# Altium footprint library Connectors THD.PcbLib: 631 footprints (part 34 of 46)
Each footprint in its own frame and in the unit in brackets; x right, y up, seen from the top. Pads: shape width x height; smd on the part's side, far side on the other; paste and mask are expansions set on the pad; w line width, h text height; cw(c..) or ccw(c..) is an arc to the next point about the centre after c.
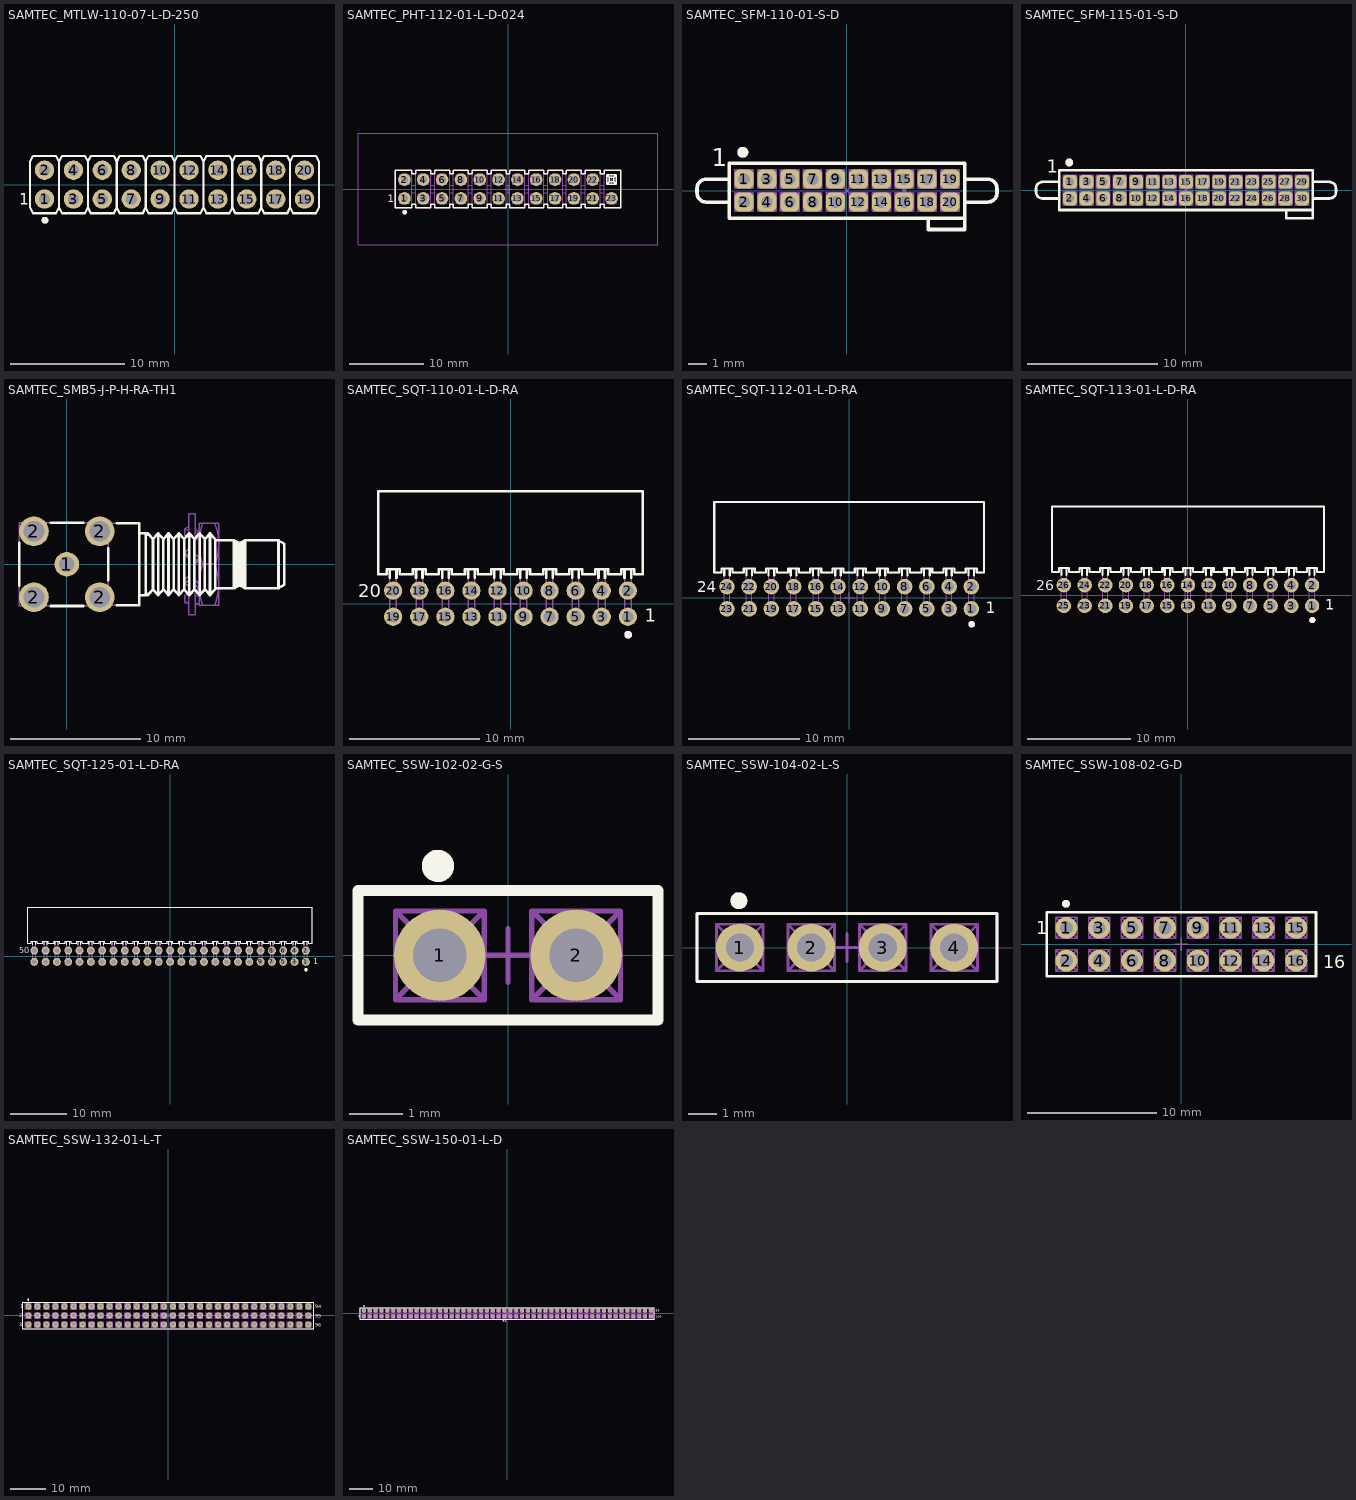
[diagram p33: the footprints below, top view; thin cyan lines are the x and y axes]

## SAMTEC_MTLW-110-07-L-D-250 [mm] "20 Contacts - Pitch 2.54mm - Dual Row Through Mount Straight Header (Post Lead = 6.35mm, Tail Lead 3.05mm, Insulator 1.52mm)"
height 7.87
pads (20):
  round 1.7 hole 1: 1(-11.43,-1.27) 2(-11.43,1.27) 3(-8.89,-1.27) 4(-8.89,1.27) 5(-6.35,-1.27) 6(-6.35,1.27) 7(-3.81,-1.27) 8(-3.81,1.27) 9(-1.27,-1.27) 10(-1.27,1.27) 11(1.27,-1.27) 12(1.27,1.27) 13(3.81,-1.27) 14(3.81,1.27) 15(6.35,-1.27) 16(6.35,1.27) 17(8.89,-1.27) 18(8.89,1.27) 19(11.43,-1.27) 20(11.43,1.27)
Top Overlay:
  circle w0.3: c-11.395,-3.135 r0.15
  lines w0.2: -10.16,-2.007 -10.414,-2.515 -12.446,-2.515 -12.7,-2.007 -12.7,2.007 -12.446,2.515 -10.414,2.515 -10.16,2.007 ; -10.16,-2.007 -10.16,2.007 ; -10.16,-2.007 -10.16,2.007 ; -10.16,-2.007 -9.906,-2.515 -7.874,-2.515 -7.62,-2.007 ; -10.16,2.007 -9.906,2.515 -7.874,2.515 -7.62,2.007 ; -7.62,-2.007 -7.62,2.007 ; -7.62,-2.007 -7.62,2.007 ; -7.62,-2.007 -7.366,-2.515 -5.334,-2.515 -5.08,-2.007 ; -7.62,2.007 -7.366,2.515 -5.334,2.515 -5.08,2.007 ; -5.08,-2.007 -5.08,2.007 ; -5.08,-2.007 -4.826,-2.515 -2.794,-2.515 -2.54,-2.007 ; -5.08,-2.007 -5.08,2.007 ; -5.08,2.007 -4.826,2.515 -2.794,2.515 -2.54,2.007 ; -2.54,-2.007 -2.54,2.007 ; -2.54,-2.007 -2.286,-2.515 -0.254,-2.515 0,-2.007 ; -2.54,-2.007 -2.54,2.007 ; -2.54,2.007 -2.286,2.515 -0.254,2.515 0,2.007 ; 0,-2.007 0,2.007 ; 0,-2.007 0.254,-2.515 2.286,-2.515 2.54,-2.007 ; 0,-2.007 0,2.007 ; 0,2.007 0.254,2.515 2.286,2.515 2.54,2.007 ; 2.54,-2.007 2.54,2.007 ; 2.54,-2.007 2.54,2.007 ; 2.54,-2.007 2.794,-2.515 4.826,-2.515 5.08,-2.007 ; 2.54,2.007 2.794,2.515 4.826,2.515 5.08,2.007 ; 5.08,-2.007 5.08,2.007 ; 5.08,-2.007 5.08,2.007 ; 5.08,-2.007 5.334,-2.515 7.366,-2.515 7.62,-2.007 ; 5.08,2.007 5.334,2.515 7.366,2.515 7.62,2.007 ; 7.62,-2.007 7.62,2.007 ; 7.62,-2.007 7.874,-2.515 9.906,-2.515 10.16,-2.007 ; 7.62,-2.007 7.62,2.007 ; 7.62,2.007 7.874,2.515 9.906,2.515 10.16,2.007 ; 10.16,-2.007 10.16,2.007 ; 10.16,-2.007 10.414,-2.515 12.446,-2.515 12.7,-2.007 12.7,2.007 12.446,2.515 10.414,2.515 10.16,2.007 ; 10.16,-2.007 10.16,2.007
  text "1" at -13.677,-1.768 h1
Mechanical 8:
  lines w0.1: -11.93,-1.27 -11.43,-1.27 ; -11.93,1.27 -11.43,1.27 ; -11.43,-1.77 -11.43,-1.27 ; -11.43,-0.77 -11.43,-1.27 ; -11.43,0.77 -11.43,1.27 ; -11.43,1.77 -11.43,1.27 ; -10.93,-1.27 -11.43,-1.27 ; -10.93,1.27 -11.43,1.27 ; -9.39,-1.27 -8.89,-1.27 ; -9.39,1.27 -8.89,1.27 ; -8.89,-1.77 -8.89,-1.27 ; -8.89,-0.77 -8.89,-1.27 ; -8.89,0.77 -8.89,1.27 ; -8.89,1.77 -8.89,1.27 ; -8.39,-1.27 -8.89,-1.27 ; -8.39,1.27 -8.89,1.27 ; -6.85,-1.27 -6.35,-1.27 ; -6.85,1.27 -6.35,1.27 ; -6.35,-1.77 -6.35,-1.27 ; -6.35,-0.77 -6.35,-1.27 ; -6.35,0.77 -6.35,1.27 ; -6.35,1.77 -6.35,1.27 ; -5.85,-1.27 -6.35,-1.27 ; -5.85,1.27 -6.35,1.27 ; -4.31,-1.27 -3.81,-1.27 ; -4.31,1.27 -3.81,1.27 ; -3.81,-1.77 -3.81,-1.27 ; -3.81,-0.77 -3.81,-1.27 ; -3.81,0.77 -3.81,1.27 ; -3.81,1.77 -3.81,1.27 ; -3.31,-1.27 -3.81,-1.27 ; -3.31,1.27 -3.81,1.27 ; -1.77,-1.27 -1.27,-1.27 ; -1.77,1.27 -1.27,1.27 ; -1.27,-1.77 -1.27,-1.27 ; -1.27,-0.77 -1.27,-1.27 ; -1.27,0.77 -1.27,1.27 ; -1.27,1.77 -1.27,1.27 ; -0.77,-1.27 -1.27,-1.27 ; -0.77,1.27 -1.27,1.27 ; -0.5,0 0,0 ; 0,-0.5 0,0 ; 0,0.5 0,0 ; 0.5,0 0,0 ; 0.77,-1.27 1.27,-1.27 ; 0.77,1.27 1.27,1.27 ; 1.27,-1.77 1.27,-1.27 ; 1.27,-0.77 1.27,-1.27 ; 1.27,0.77 1.27,1.27 ; 1.27,1.77 1.27,1.27 ; 1.77,-1.27 1.27,-1.27 ; 1.77,1.27 1.27,1.27 ; 3.31,-1.27 3.81,-1.27 ; 3.31,1.27 3.81,1.27 ; 3.81,-1.77 3.81,-1.27 ; 3.81,-0.77 3.81,-1.27 ; 3.81,0.77 3.81,1.27 ; 3.81,1.77 3.81,1.27 ; 4.31,-1.27 3.81,-1.27 ; 4.31,1.27 3.81,1.27 ; 5.85,-1.27 6.35,-1.27 ; 5.85,1.27 6.35,1.27 ; 6.35,-1.77 6.35,-1.27 ; 6.35,-0.77 6.35,-1.27 ; 6.35,0.77 6.35,1.27 ; 6.35,1.77 6.35,1.27 ; 6.85,-1.27 6.35,-1.27 ; 6.85,1.27 6.35,1.27 ; 8.39,-1.27 8.89,-1.27 ; 8.39,1.27 8.89,1.27 ; 8.89,-1.77 8.89,-1.27 ; 8.89,-0.77 8.89,-1.27 ; 8.89,0.77 8.89,1.27 ; 8.89,1.77 8.89,1.27 ; 9.39,-1.27 8.89,-1.27 ; 9.39,1.27 8.89,1.27 ; 10.93,-1.27 11.43,-1.27 ; 10.93,1.27 11.43,1.27 ; 11.43,-1.77 11.43,-1.27 ; 11.43,-0.77 11.43,-1.27 ; 11.43,0.77 11.43,1.27 ; 11.43,1.77 11.43,1.27 ; 11.93,-1.27 11.43,-1.27 ; 11.93,1.27 11.43,1.27
Mechanical 14:
  drawing of 161 lines, arcs and shapes, not listed
  text "1" at -13.677,-1.768 h1
3D body: height 7.87, standoff -3.05, extent -12.7,-2.514 12.7,2.515

## SAMTEC_PHT-112-01-L-D-024 [mm] "23 Contacts +1 Polarized Position(24) , Pitch 2.54mm - Dual Row, Press-Fit Straigh Header"
height 11.48
pads (23):
  round 1.7 hole 1: 1(-13.97,-1.27) 2(-13.97,1.27) 3(-11.43,-1.27) 4(-11.43,1.27) 5(-8.89,-1.27) 6(-8.89,1.27) 7(-6.35,-1.27) 8(-6.35,1.27) 9(-3.81,-1.27) 10(-3.81,1.27) 11(-1.27,-1.27) 12(-1.27,1.27) 13(1.27,-1.27) 14(1.27,1.27) 15(3.81,-1.27) 16(3.81,1.27) 17(6.35,-1.27) 18(6.35,1.27) 19(8.89,-1.27) 20(8.89,1.27) 21(11.43,-1.27) 22(11.43,1.27) 23(13.97,-1.27)
Top Overlay:
  circle w0.3: c-13.935,-3.135 r0.15
  lines w0.2: -12.827,-2.032 -12.573,-2.032 ; -10.287,-2.032 -10.033,-2.032 ; -10.287,2.032 -10.033,2.032 ; 13.322,0.622 14.618,0.622 ; 13.322,0.622 13.322,1.918 ; 13.322,0.622 13.653,0.953 ; 13.322,1.918 14.618,1.918 ; 13.322,1.918 13.653,1.587 ; 13.653,0.953 14.288,0.953 ; 13.653,0.953 13.653,1.587 ; 13.653,1.587 14.288,1.587 ; 14.288,0.953 14.288,1.587 ; 14.288,0.953 14.618,0.622 ; 14.288,1.587 14.618,1.918 ; 14.618,0.622 14.618,1.918 ; 15.24,-2.515 15.24,2.515 ; 15.24,-2.515 12.954,-2.515 12.954,-2.032 12.446,-2.032 12.446,-2.515 10.414,-2.515 10.414,-2.032 9.906,-2.032 9.906,-2.515 7.874,-2.515 7.874,-2.032 7.366,-2.032 7.366,-2.515 5.334,-2.515 5.334,-2.032 4.826,-2.032 4.826,-2.515 2.794,-2.515 2.794,-2.032 2.286,-2.032 2.286,-2.515 0.254,-2.515 0.254,-2.032 -0.254,-2.032 -0.254,-2.515 -2.286,-2.515 -2.286,-2.032 -2.794,-2.032 -2.794,-2.515 -4.826,-2.515 -4.826,-2.032 -5.334,-2.032 -5.334,-2.515 -7.366,-2.515 -7.366,-2.032 -7.874,-2.032 -7.874,-2.515 -9.906,-2.515 -9.906,-2.032 -10.414,-2.032 -10.414,-2.515 -12.446,-2.515 -12.446,-2.032 -12.954,-2.032 -12.954,-2.515 -15.24,-2.515 -15.24,2.515 -12.954,2.515 -12.954,2.032 -12.446,2.032 -12.446,2.515 -10.414,2.515 -10.414,2.032 -9.906,2.032 -9.906,2.515 -7.874,2.515 -7.874,2.032 -7.366,2.032 -7.366,2.515 -5.334,2.515 -5.334,2.032 -4.826,2.032 -4.826,2.515 -2.794,2.515 -2.794,2.032 -2.286,2.032 -2.286,2.515 -0.254,2.515 -0.254,2.032 0.254,2.032 0.254,2.515 2.286,2.515 2.286,2.032 2.794,2.032 2.794,2.515 4.826,2.515 4.826,2.032 5.334,2.032 5.334,2.515 7.366,2.515 7.366,2.032 7.874,2.032 7.874,2.515 9.906,2.515 9.906,2.032 10.414,2.032 10.414,2.515 12.446,2.515 12.446,2.032 12.954,2.032 12.954,2.515 15.24,2.515 ; 15.24,-2.515 15.24,2.515
  text "1" at -16.217,-1.768 h1
Mechanical 8:
  lines w0.1: -14.47,-1.27 -13.97,-1.27 ; -14.47,1.27 -13.97,1.27 ; -13.97,-1.77 -13.97,-1.27 ; -13.97,-0.77 -13.97,-1.27 ; -13.97,0.77 -13.97,1.27 ; -13.97,1.77 -13.97,1.27 ; -13.47,-1.27 -13.97,-1.27 ; -13.47,1.27 -13.97,1.27 ; -11.93,-1.27 -11.43,-1.27 ; -11.93,1.27 -11.43,1.27 ; -11.43,-1.77 -11.43,-1.27 ; -11.43,-0.77 -11.43,-1.27 ; -11.43,0.77 -11.43,1.27 ; -11.43,1.77 -11.43,1.27 ; -10.93,-1.27 -11.43,-1.27 ; -10.93,1.27 -11.43,1.27 ; -9.39,-1.27 -8.89,-1.27 ; -9.39,1.27 -8.89,1.27 ; -8.89,-1.77 -8.89,-1.27 ; -8.89,-0.77 -8.89,-1.27 ; -8.89,0.77 -8.89,1.27 ; -8.89,1.77 -8.89,1.27 ; -8.39,-1.27 -8.89,-1.27 ; -8.39,1.27 -8.89,1.27 ; -6.85,-1.27 -6.35,-1.27 ; -6.85,1.27 -6.35,1.27 ; -6.35,-1.77 -6.35,-1.27 ; -6.35,-0.77 -6.35,-1.27 ; -6.35,0.77 -6.35,1.27 ; -6.35,1.77 -6.35,1.27 ; -5.85,-1.27 -6.35,-1.27 ; -5.85,1.27 -6.35,1.27 ; -4.31,-1.27 -3.81,-1.27 ; -4.31,1.27 -3.81,1.27 ; -3.81,-1.77 -3.81,-1.27 ; -3.81,-0.77 -3.81,-1.27 ; -3.81,0.77 -3.81,1.27 ; -3.81,1.77 -3.81,1.27 ; -3.31,-1.27 -3.81,-1.27 ; -3.31,1.27 -3.81,1.27 ; -1.77,-1.27 -1.27,-1.27 ; -1.77,1.27 -1.27,1.27 ; -1.27,-1.77 -1.27,-1.27 ; -1.27,-0.77 -1.27,-1.27 ; -1.27,0.77 -1.27,1.27 ; -1.27,1.77 -1.27,1.27 ; -0.77,-1.27 -1.27,-1.27 ; -0.77,1.27 -1.27,1.27 ; -0.5,0 0,0 ; 0,-0.5 0,0 ; 0,0.5 0,0 ; 0.5,0 0,0 ; 0.77,-1.27 1.27,-1.27 ; 0.77,1.27 1.27,1.27 ; 1.27,-1.77 1.27,-1.27 ; 1.27,-0.77 1.27,-1.27 ; 1.27,0.77 1.27,1.27 ; 1.27,1.77 1.27,1.27 ; 1.77,-1.27 1.27,-1.27 ; 1.77,1.27 1.27,1.27 ; 3.31,-1.27 3.81,-1.27 ; 3.31,1.27 3.81,1.27 ; 3.81,-1.77 3.81,-1.27 ; 3.81,-0.77 3.81,-1.27 ; 3.81,0.77 3.81,1.27 ; 3.81,1.77 3.81,1.27 ; 4.31,-1.27 3.81,-1.27 ; 4.31,1.27 3.81,1.27 ; 5.85,-1.27 6.35,-1.27 ; 5.85,1.27 6.35,1.27 ; 6.35,-1.77 6.35,-1.27 ; 6.35,-0.77 6.35,-1.27 ; 6.35,0.77 6.35,1.27 ; 6.35,1.77 6.35,1.27 ; 6.85,-1.27 6.35,-1.27 ; 6.85,1.27 6.35,1.27 ; 8.39,-1.27 8.89,-1.27 ; 8.39,1.27 8.89,1.27 ; 8.89,-1.77 8.89,-1.27 ; 8.89,-0.77 8.89,-1.27 ; 8.89,0.77 8.89,1.27 ; 8.89,1.77 8.89,1.27 ; 9.39,-1.27 8.89,-1.27 ; 9.39,1.27 8.89,1.27 ; 10.93,-1.27 11.43,-1.27 ; 10.93,1.27 11.43,1.27 ; 11.43,-1.77 11.43,-1.27 ; 11.43,-0.77 11.43,-1.27 ; 11.43,0.77 11.43,1.27 ; 11.43,1.77 11.43,1.27 ; 11.93,-1.27 11.43,-1.27 ; 11.93,1.27 11.43,1.27 ; 13.47,-1.27 13.97,-1.27 ; 13.47,1.27 13.97,1.27 ; 13.97,-1.77 13.97,-1.27 ; 13.97,-0.77 13.97,-1.27 ; 13.97,0.77 13.97,1.27 ; 13.97,1.77 13.97,1.27 ; 14.47,-1.27 13.97,-1.27 ; 14.47,1.27 13.97,1.27
Mechanical 14:
  drawing of 380 lines, arcs and shapes, not listed
  text "1" at -16.217,-1.768 h1
Mechanical 15:
  lines w0.05: -20.24,-7.54 20.24,-7.54 20.24,7.54 -20.24,7.54 -20.24,-7.54
  text "Do Not Put Any Component With a Height More Than" at -19.6,3.075 h1
  text "4mm Tickness on a Zone of 5mm Around The Connector." at -20.24,-3.775 h1
Drill Drawing:
  lines w0.1: -15.24,-4.81 -15.24,4.6 15.24,4.6 15.24,-4.81 -15.24,-4.81
  text "Diam. 1mm +0.09 -0.06" at -9.45,-4.15 h1
  text "PRESS-FIT TECHNOLOGY" at -9.3,3.15 h1
3D body: height 8.38, standoff -3.1, extent -15.24,-2.515 15.24,2.515

## SAMTEC_SFM-110-01-S-D [mm] "20 Contacts - Pitch 1.27mm - Dual Row Straight Through-Hole Socket"
height 4.57
pads (20):
  rrect50% 1.05x1.05 hole 0.65: 1(-5.715,0.635) 2(-5.715,-0.635) 3(-4.445,0.635) 4(-4.445,-0.635) 5(-3.175,0.635) 6(-3.175,-0.635) 7(-1.905,0.635) 8(-1.905,-0.635) 9(-0.635,0.635) 10(-0.635,-0.635) 11(0.635,0.635) 12(0.635,-0.635) 13(1.905,0.635) 14(1.905,-0.635) 15(3.175,0.635) 16(3.175,-0.635) 17(4.445,0.635) 18(4.445,-0.635) 19(5.715,0.635) 20(5.715,-0.635)
Top Overlay:
  circle w0.3: c-5.775,2.125 r0.15
  lines w0.2: -6.54,-0.635 -7.81,-0.635 cw(c-7.81,-0.127) -8.318,-0.127 -8.318,0.127 cw(c-7.81,0.127) -7.81,0.635 -6.54,0.635 ; 4.509,-1.524 4.509,-2.159 6.541,-2.159 6.541,1.524 -6.54,1.524 -6.54,-1.524 6.541,-1.524 ; 6.541,-0.635 7.811,-0.635 ccw(c7.811,-0.127) 8.319,-0.127 8.319,0.127 ccw(c7.811,0.127) 7.811,0.635 6.541,0.635
  text "1" at -7.487,1.337 h1
Mechanical 8:
  lines w0.1: -6.215,-0.635 -5.715,-0.635 ; -6.215,0.635 -5.715,0.635 ; -5.715,-1.135 -5.715,-0.635 ; -5.715,-0.135 -5.715,-0.635 ; -5.715,0.135 -5.715,0.635 ; -5.715,1.135 -5.715,0.635 ; -5.215,-0.635 -5.715,-0.635 ; -5.215,0.635 -5.715,0.635 ; -4.945,-0.635 -4.445,-0.635 ; -4.945,0.635 -4.445,0.635 ; -4.445,-1.135 -4.445,-0.635 ; -4.445,-0.135 -4.445,-0.635 ; -4.445,0.135 -4.445,0.635 ; -4.445,1.135 -4.445,0.635 ; -3.945,-0.635 -4.445,-0.635 ; -3.945,0.635 -4.445,0.635 ; -3.675,-0.635 -3.175,-0.635 ; -3.675,0.635 -3.175,0.635 ; -3.175,-1.135 -3.175,-0.635 ; -3.175,-0.135 -3.175,-0.635 ; -3.175,0.135 -3.175,0.635 ; -3.175,1.135 -3.175,0.635 ; -2.675,-0.635 -3.175,-0.635 ; -2.675,0.635 -3.175,0.635 ; -2.405,-0.635 -1.905,-0.635 ; -2.405,0.635 -1.905,0.635 ; -1.905,-1.135 -1.905,-0.635 ; -1.905,-0.135 -1.905,-0.635 ; -1.905,0.135 -1.905,0.635 ; -1.905,1.135 -1.905,0.635 ; -1.405,-0.635 -1.905,-0.635 ; -1.405,0.635 -1.905,0.635 ; -1.135,-0.635 -0.635,-0.635 ; -1.135,0.635 -0.635,0.635 ; -0.635,-1.135 -0.635,-0.635 ; -0.635,-0.135 -0.635,-0.635 ; -0.635,0.135 -0.635,0.635 ; -0.635,1.135 -0.635,0.635 ; -0.354,-0.354 0,0 ; -0.354,0.354 0,0 ; -0.135,-0.635 -0.635,-0.635 ; -0.135,0.635 -0.635,0.635 ; 0.135,-0.635 0.635,-0.635 ; 0.135,0.635 0.635,0.635 ; 0.354,-0.354 0,0 ; 0.354,0.354 0,0 ; 0.635,-1.135 0.635,-0.635 ; 0.635,-0.135 0.635,-0.635 ; 0.635,0.135 0.635,0.635 ; 0.635,1.135 0.635,0.635 ; 1.135,-0.635 0.635,-0.635 ; 1.135,0.635 0.635,0.635 ; 1.405,-0.635 1.905,-0.635 ; 1.405,0.635 1.905,0.635 ; 1.905,-1.135 1.905,-0.635 ; 1.905,-0.135 1.905,-0.635 ; 1.905,0.135 1.905,0.635 ; 1.905,1.135 1.905,0.635 ; 2.405,-0.635 1.905,-0.635 ; 2.405,0.635 1.905,0.635 ; 2.675,-0.635 3.175,-0.635 ; 2.675,0.635 3.175,0.635 ; 2.821,-0.354 3.175,0 ; 2.821,0.354 3.175,0 ; 3.175,-1.135 3.175,-0.635 ; 3.175,-0.135 3.175,-0.635 ; 3.175,0.135 3.175,0.635 ; 3.175,1.135 3.175,0.635 ; 3.529,-0.354 3.175,0 ; 3.529,0.354 3.175,0 ; 3.675,-0.635 3.175,-0.635 ; 3.675,0.635 3.175,0.635 ; 3.945,-0.635 4.445,-0.635 ; 3.945,0.635 4.445,0.635 ; 4.445,-1.135 4.445,-0.635 ; 4.445,-0.135 4.445,-0.635 ; 4.445,0.135 4.445,0.635 ; 4.445,1.135 4.445,0.635 ; 4.945,-0.635 4.445,-0.635 ; 4.945,0.635 4.445,0.635 ; 5.215,-0.635 5.715,-0.635 ; 5.215,0.635 5.715,0.635 ; 5.715,-1.135 5.715,-0.635 ; 5.715,-0.135 5.715,-0.635 ; 5.715,0.135 5.715,0.635 ; 5.715,1.135 5.715,0.635 ; 6.215,-0.635 5.715,-0.635 ; 6.215,0.635 5.715,0.635
Mechanical 14:
  drawing of 385 lines, arcs and shapes, not listed
  text "1" at -7.487,1.337 h1
3D body: height 4.57, standoff -2.74, extent -8.318,-2.159 8.319,1.524

## SAMTEC_SFM-115-01-S-D [mm] "30 Contacts - Pitch 1.27mm - Dual Row Straight Through-Hole Socket"
height 4.57
pads (30):
  rrect50% 1.05x1.05 hole 0.65: 1(-8.89,0.635) 2(-8.89,-0.635) 3(-7.62,0.635) 4(-7.62,-0.635) 5(-6.35,0.635) 6(-6.35,-0.635) 7(-5.08,0.635) 8(-5.08,-0.635) 9(-3.81,0.635) 10(-3.81,-0.635) 11(-2.54,0.635) 12(-2.54,-0.635) 13(-1.27,0.635) 14(-1.27,-0.635) 15(0,0.635) 16(0,-0.635) 17(1.27,0.635) 18(1.27,-0.635) 19(2.54,0.635) 20(2.54,-0.635) 21(3.81,0.635) 22(3.81,-0.635) 23(5.08,0.635) 24(5.08,-0.635) 25(6.35,0.635) 26(6.35,-0.635) 27(7.62,0.635) 28(7.62,-0.635) 29(8.89,0.635) 30(8.89,-0.635)
Top Overlay:
  circle w0.3: c-8.95,2.125 r0.15
  lines w0.2: -9.715,-0.635 -10.985,-0.635 cw(c-10.985,-0.127) -11.493,-0.127 -11.493,0.127 cw(c-10.985,0.127) -10.985,0.635 -9.715,0.635 ; 7.684,-1.524 7.684,-2.159 9.716,-2.159 9.716,1.524 -9.715,1.524 -9.715,-1.524 9.716,-1.524 ; 9.716,-0.635 10.986,-0.635 ccw(c10.986,-0.127) 11.494,-0.127 11.494,0.127 ccw(c10.986,0.127) 10.986,0.635 9.716,0.635
  text "1" at -10.662,1.337 h1
Mechanical 8:
  lines w0.1: -9.39,-0.635 -8.89,-0.635 ; -9.39,0.635 -8.89,0.635 ; -8.89,-1.135 -8.89,-0.635 ; -8.89,-0.135 -8.89,-0.635 ; -8.89,0.135 -8.89,0.635 ; -8.89,1.135 -8.89,0.635 ; -8.39,-0.635 -8.89,-0.635 ; -8.39,0.635 -8.89,0.635 ; -8.12,-0.635 -7.62,-0.635 ; -8.12,0.635 -7.62,0.635 ; -7.62,-1.135 -7.62,-0.635 ; -7.62,-0.135 -7.62,-0.635 ; -7.62,0.135 -7.62,0.635 ; -7.62,1.135 -7.62,0.635 ; -7.12,-0.635 -7.62,-0.635 ; -7.12,0.635 -7.62,0.635 ; -6.85,-0.635 -6.35,-0.635 ; -6.85,0.635 -6.35,0.635 ; -6.35,-1.135 -6.35,-0.635 ; -6.35,-0.135 -6.35,-0.635 ; -6.35,0.135 -6.35,0.635 ; -6.35,1.135 -6.35,0.635 ; -5.85,-0.635 -6.35,-0.635 ; -5.85,0.635 -6.35,0.635 ; -5.58,-0.635 -5.08,-0.635 ; -5.58,0.635 -5.08,0.635 ; -5.08,-1.135 -5.08,-0.635 ; -5.08,-0.135 -5.08,-0.635 ; -5.08,0.135 -5.08,0.635 ; -5.08,1.135 -5.08,0.635 ; -4.58,-0.635 -5.08,-0.635 ; -4.58,0.635 -5.08,0.635 ; -4.31,-0.635 -3.81,-0.635 ; -4.31,0.635 -3.81,0.635 ; -3.81,-1.135 -3.81,-0.635 ; -3.81,-0.135 -3.81,-0.635 ; -3.81,0.135 -3.81,0.635 ; -3.81,1.135 -3.81,0.635 ; -3.31,-0.635 -3.81,-0.635 ; -3.31,0.635 -3.81,0.635 ; -3.04,-0.635 -2.54,-0.635 ; -3.04,0.635 -2.54,0.635 ; -2.54,-1.135 -2.54,-0.635 ; -2.54,-0.135 -2.54,-0.635 ; -2.54,0.135 -2.54,0.635 ; -2.54,1.135 -2.54,0.635 ; -2.04,-0.635 -2.54,-0.635 ; -2.04,0.635 -2.54,0.635 ; -1.77,-0.635 -1.27,-0.635 ; -1.77,0.635 -1.27,0.635 ; -1.27,-1.135 -1.27,-0.635 ; -1.27,-0.135 -1.27,-0.635 ; -1.27,0.135 -1.27,0.635 ; -1.27,1.135 -1.27,0.635 ; -0.77,-0.635 -1.27,-0.635 ; -0.77,0.635 -1.27,0.635 ; -0.5,-0.635 0,-0.635 ; -0.5,0.635 0,0.635 ; -0.354,-0.354 0,0 ; -0.354,0.354 0,0 ; 0,-1.135 0,-0.635 ; 0,-0.135 0,-0.635 ; 0,0.135 0,0.635 ; 0,1.135 0,0.635 ; 0.354,-0.354 0,0 ; 0.354,0.354 0,0 ; 0.5,-0.635 0,-0.635 ; 0.5,0.635 0,0.635 ; 0.77,-0.635 1.27,-0.635 ; 0.77,0.635 1.27,0.635 ; 1.27,-1.135 1.27,-0.635 ; 1.27,-0.135 1.27,-0.635 ; 1.27,0.135 1.27,0.635 ; 1.27,1.135 1.27,0.635 ; 1.77,-0.635 1.27,-0.635 ; 1.77,0.635 1.27,0.635 ; 2.04,-0.635 2.54,-0.635 ; 2.04,0.635 2.54,0.635 ; 2.54,-1.135 2.54,-0.635 ; 2.54,-0.135 2.54,-0.635 ; 2.54,0.135 2.54,0.635 ; 2.54,1.135 2.54,0.635 ; 3.04,-0.635 2.54,-0.635 ; 3.04,0.635 2.54,0.635 ; 3.31,-0.635 3.81,-0.635 ; 3.31,0.635 3.81,0.635 ; 3.81,-1.135 3.81,-0.635 ; 3.81,-0.135 3.81,-0.635 ; 3.81,0.135 3.81,0.635 ; 3.81,1.135 3.81,0.635 ; 4.31,-0.635 3.81,-0.635 ; 4.31,0.635 3.81,0.635 ; 4.58,-0.635 5.08,-0.635 ; 4.58,0.635 5.08,0.635 ; 5.08,-1.135 5.08,-0.635 ; 5.08,-0.135 5.08,-0.635 ; 5.08,0.135 5.08,0.635 ; 5.08,1.135 5.08,0.635 ; 5.58,-0.635 5.08,-0.635 ; 5.58,0.635 5.08,0.635 ; 5.85,-0.635 6.35,-0.635 ; 5.85,0.635 6.35,0.635 ; 6.35,-1.135 6.35,-0.635 ; 6.35,-0.135 6.35,-0.635 ; 6.35,0.135 6.35,0.635 ; 6.35,1.135 6.35,0.635 ; 6.85,-0.635 6.35,-0.635 ; 6.85,0.635 6.35,0.635 ; 7.12,-0.635 7.62,-0.635 ; 7.12,0.635 7.62,0.635 ; 7.62,-1.135 7.62,-0.635 ; 7.62,-0.135 7.62,-0.635 ; 7.62,0.135 7.62,0.635 ; 7.62,1.135 7.62,0.635 ; 8.12,-0.635 7.62,-0.635 ; 8.12,0.635 7.62,0.635 ; 8.39,-0.635 8.89,-0.635 ; 8.39,0.635 8.89,0.635 ; 8.89,-1.135 8.89,-0.635 ; 8.89,-0.135 8.89,-0.635 ; 8.89,0.135 8.89,0.635 ; 8.89,1.135 8.89,0.635 ; 9.39,-0.635 8.89,-0.635 ; 9.39,0.635 8.89,0.635
Mechanical 14:
  drawing of 377 lines, arcs and shapes, not listed
  text "1" at -10.662,1.337 h1
3D body: height 4.57, standoff -2.74, extent -11.493,-2.159 11.494,1.524

## SAMTEC_SMB5-J-P-H-RA-TH1 [mm] "50 Ohm SMB Right Angle PCB Jack"
height 8.13
pads (5):
  round 1.9 hole 1.2: 1(0,0)
  round 2.3 hole 1.6: 2(-2.54,-2.54) 2(-2.54,2.54) 2(2.54,-2.54) 2(2.54,2.54)
Top Overlay:
  lines w0.2: -3.68,-1.644 -3.68,1.644 ; -1.257,-3.215 1.257,-3.215 ; -1.257,3.215 1.257,3.215 ; 3.844,-3.174 5.59,-3.174 5.59,3.174 3.844,3.174 ; 5.59,-2.4 6.09,-2.4 6.09,2.4 5.59,2.4 ; 6.09,-2.214 6.24,-2.38 6.64,-1.937 ; 6.09,2.214 6.24,2.38 6.64,1.937 ; 11.44,-1.84 12.872,-1.84 ; 11.44,1.84 12.872,1.84 ; 6.64,-1.937 7.04,-2.38 ; 6.64,-1.937 6.64,1.937 ; 6.64,1.937 7.04,2.38 ; 7.04,-2.38 7.44,-1.937 ; 7.04,-2.38 7.04,2.38 ; 7.04,2.38 7.44,1.937 ; 7.44,-1.937 7.84,-2.38 ; 7.44,-1.937 7.44,1.937 ; 7.44,1.937 7.84,2.38 ; 7.84,-2.38 8.24,-1.937 ; 7.84,-2.38 7.84,2.38 ; 7.84,2.38 8.24,1.937 ; 8.24,-1.937 8.64,-2.38 ; 8.24,-1.937 8.24,1.937 ; 8.24,1.937 8.64,2.38 ; 8.64,-2.38 9.04,-1.937 ; 8.64,-2.38 8.64,2.38 ; 8.64,2.38 9.04,1.937 ; 9.04,-1.937 9.44,-2.38 ; 9.04,-1.937 9.04,1.937 ; 9.04,1.937 9.44,2.38 ; 9.44,-2.38 9.84,-1.937 ; 9.44,-2.38 9.44,2.38 ; 9.44,2.38 9.84,1.937 ; 9.84,-1.937 10.24,-2.38 ; 9.84,-1.937 9.84,1.937 ; 9.84,1.937 10.24,2.38 ; 10.24,-2.38 10.64,-1.937 ; 10.24,-2.38 10.24,2.38 ; 10.24,2.38 10.64,1.937 ; 10.64,-1.937 11.04,-2.38 ; 10.64,-1.937 10.64,1.937 ; 10.64,1.937 11.04,2.38 ; 11.04,-2.38 11.44,-1.937 11.44,1.937 11.04,2.38 ; 11.04,-2.38 11.04,2.38 ; 12.872,-1.84 ccw(c12.872,-1.689) 12.952,-1.817 ; 12.872,-1.84 12.872,1.84 ; 12.872,1.84 cw(c12.872,1.689) 12.952,1.817 ; 12.952,-1.817 12.952,1.817 ; 12.952,-1.817 13.156,-1.689 ; 12.952,1.817 13.156,1.689 ; 13.156,-1.689 cw(c13.22,-1.792) 13.22,-1.671 ; 13.156,-1.689 13.156,1.689 ; 13.156,1.689 ccw(c13.22,1.792) 13.22,1.671 ; 13.22,-1.671 13.22,1.671 ; 13.22,-1.671 13.42,-1.671 ; 13.22,1.671 13.42,1.671 ; 13.42,-1.671 cw(c13.42,-1.791) 13.484,-1.689 ; 13.42,-1.671 13.42,1.671 ; 13.42,1.671 ccw(c13.42,1.791) 13.484,1.689 ; 13.484,-1.689 13.484,1.689 ; 13.484,-1.689 13.688,-1.817 ; 13.484,1.689 13.688,1.817 ; 13.688,-1.817 ccw(c13.768,-1.689) 13.768,-1.84 ; 13.688,-1.817 13.688,1.817 ; 13.688,1.817 cw(c13.768,1.689) 13.768,1.84 ; 13.768,-1.84 13.768,1.84 ; 13.768,-1.84 16.32,-1.84 ; 13.768,1.84 16.32,1.84 ; 16.32,-1.84 16.77,-1.582 16.77,1.582 16.32,1.84 ; 16.32,-1.84 16.32,1.84 ; 3.18,-1.239 3.18,1.239 3.18,-1.239
Mechanical 8:
  lines w0.1: -3.04,-2.54 -2.54,-2.54 ; -3.04,2.54 -2.54,2.54 ; -2.54,-3.04 -2.54,-2.54 ; -2.54,-2.04 -2.54,-2.54 ; -2.54,2.04 -2.54,2.54 ; -2.54,3.04 -2.54,2.54 ; -2.04,-2.54 -2.54,-2.54 ; -2.04,2.54 -2.54,2.54 ; -0.5,0 0,0 ; 0,-0.5 0,0 ; 0,0.5 0,0 ; 0.5,0 0,0 ; 2.04,-2.54 2.54,-2.54 ; 2.04,2.54 2.54,2.54 ; 2.54,-3.04 2.54,-2.54 ; 2.54,-2.04 2.54,-2.54 ; 2.54,2.04 2.54,2.54 ; 2.54,3.04 2.54,2.54 ; 3.04,-2.54 2.54,-2.54 ; 3.04,2.54 2.54,2.54 ; 9.395,-2.34 9.105,-2.387 9.105,-2.973 ; 9.405,-3.045 9.105,-2.973 ; 9.405,-2.901 9.105,-2.973 ; 9.405,-1.677 9.105,-1.459 ; 9.405,-1.226 9.105,-1.459 ; 9.405,-0.927 9.105,-1.14 9.105,-1.459 ; 9.405,0.459 9.105,0.776 9.105,0.909 ; 9.405,0.592 9.105,0.909 ; 9.405,1.179 9.105,0.909 ; 9.405,2.064 9.105,2.237 9.105,2.744 ; 9.405,2.571 9.105,2.744 ; 9.405,2.892 9.105,2.744 ; 9.905,-3.135 10.205,-3.063 ; 9.905,-2.991 10.205,-3.063 ; 9.905,-2.078 10.205,-1.844 ; 9.905,-1.569 10.205,-1.844 ; 9.905,-1.249 10.205,-1.524 10.205,-1.844 ; 9.905,0.052 10.205,0.369 ; 9.905,0.185 10.205,0.502 9.905,0.772 ; 9.905,0.197 9.905,0.469 ; 9.905,1.847 10.205,1.995 10.205,2.502 ; 9.905,2.355 10.205,2.502 ; 9.905,2.675 10.205,2.502 ; 9.915,-2.43 10.205,-2.478 10.205,-3.063 ; 10.205,-3.073 10.205,-2.373 ; 10.489,-3.175 cw(c14.774,-1.587) 10.489,0 11.421,0 cw(c7.136,-1.587) 11.421,-3.175 ; 10.489,-0.019 cw(c14.824,1.578) 10.489,3.175 ; 11.421,-0.019 ccw(c7.086,1.578) 11.421,3.175 ; 9.905,-3.9 9.905,3.9 ; 9.905,-3.9 9.905,3.9 ; 9.905,-3.9 9.405,-3.9 9.405,3.9 9.905,3.9 ; 10.205,-3.175 11.705,-3.175 11.705,3.175 10.205,3.175 10.205,-3.175
Mechanical 14:
  circle w0.1: c0,0 r0.63
  lines w0.1: 3.18,-3.174 5.59,-3.174 5.59,3.174 3.18,3.174 ; 3.18,-3.149 3.18,3.149 ; 5.59,-2.4 6.09,-2.4 6.09,2.4 5.59,2.4 ; 6.09,-2.214 6.24,-2.38 6.64,-1.937 ; 6.09,2.214 6.24,2.38 6.64,1.937 ; 11.44,-1.84 12.872,-1.84 ; 11.44,1.84 12.872,1.84 ; 6.64,-1.937 7.04,-2.38 ; 6.64,-1.937 6.64,1.937 ; 6.64,1.937 7.04,2.38 ; 7.04,-2.38 7.44,-1.937 ; 7.04,-2.38 7.04,2.38 ; 7.04,2.38 7.44,1.937 ; 7.44,-1.937 7.84,-2.38 ; 7.44,-1.937 7.44,1.937 ; 7.44,1.937 7.84,2.38 ; 7.84,-2.38 8.24,-1.937 ; 7.84,-2.38 7.84,2.38 ; 7.84,2.38 8.24,1.937 ; 8.24,-1.937 8.64,-2.38 ; 8.24,-1.937 8.24,1.937 ; 8.24,1.937 8.64,2.38 ; 8.64,-2.38 9.04,-1.937 ; 8.64,-2.38 8.64,2.38 ; 8.64,2.38 9.04,1.937 ; 9.04,-1.937 9.44,-2.38 ; 9.04,-1.937 9.04,1.937 ; 9.04,1.937 9.44,2.38 ; 9.44,-2.38 9.84,-1.937 ; 9.44,-2.38 9.44,2.38 ; 9.44,2.38 9.84,1.937 ; 9.84,-1.937 10.24,-2.38 ; 9.84,-1.937 9.84,1.937 ; 9.84,1.937 10.24,2.38 ; 10.24,-2.38 10.64,-1.937 ; 10.24,-2.38 10.24,2.38 ; 10.24,2.38 10.64,1.937 ; 10.64,-1.937 11.04,-2.38 ; 10.64,-1.937 10.64,1.937 ; 10.64,1.937 11.04,2.38 ; 11.04,-2.38 11.44,-1.937 11.44,1.937 11.04,2.38 ; 11.04,-2.38 11.04,2.38 ; 12.872,-1.84 ccw(c12.872,-1.689) 12.952,-1.817 ; 12.872,-1.84 12.872,1.84 ; 12.872,1.84 cw(c12.872,1.689) 12.952,1.817 ; 12.952,-1.817 12.952,1.817 ; 12.952,-1.817 13.156,-1.689 ; 12.952,1.817 13.156,1.689 ; 13.156,-1.689 cw(c13.22,-1.792) 13.22,-1.671 ; 13.156,-1.689 13.156,1.689 ; 13.156,1.689 ccw(c13.22,1.792) 13.22,1.671 ; 13.22,-1.671 13.22,1.671 ; 13.22,-1.671 13.42,-1.671 ; 13.22,1.671 13.42,1.671 ; 13.42,-1.671 cw(c13.42,-1.791) 13.484,-1.689 ; 13.42,-1.671 13.42,1.671 ; 13.42,1.671 ccw(c13.42,1.791) 13.484,1.689 ; 13.484,-1.689 13.484,1.689 ; 13.484,-1.689 13.688,-1.817 ; 13.484,1.689 13.688,1.817 ; 13.688,-1.817 ccw(c13.768,-1.689) 13.768,-1.84 ; 13.688,-1.817 13.688,1.817 ; 13.688,1.817 cw(c13.768,1.689) 13.768,1.84 ; 13.768,-1.84 13.768,1.84 ; 13.768,-1.84 16.32,-1.84 ; 13.768,1.84 16.32,1.84 ; 16.32,-1.84 16.77,-1.582 16.77,1.582 16.32,1.84 ; 16.32,-1.84 16.32,1.84 ; -3.68,-3.215 3.18,-3.215 3.18,3.215 -3.68,3.215 -3.68,-3.215